# Altium footprint library THU.PcbLib: 477 footprints (part 15 of 30)
Each footprint in its own frame and in the unit in brackets; x right, y up, seen from the top. Pads: shape width x height; smd on the part's side, far side on the other; paste and mask are expansions set on the pad; w line width, h text height; cw(c..) or ccw(c..) is an arc to the next point about the centre after c.
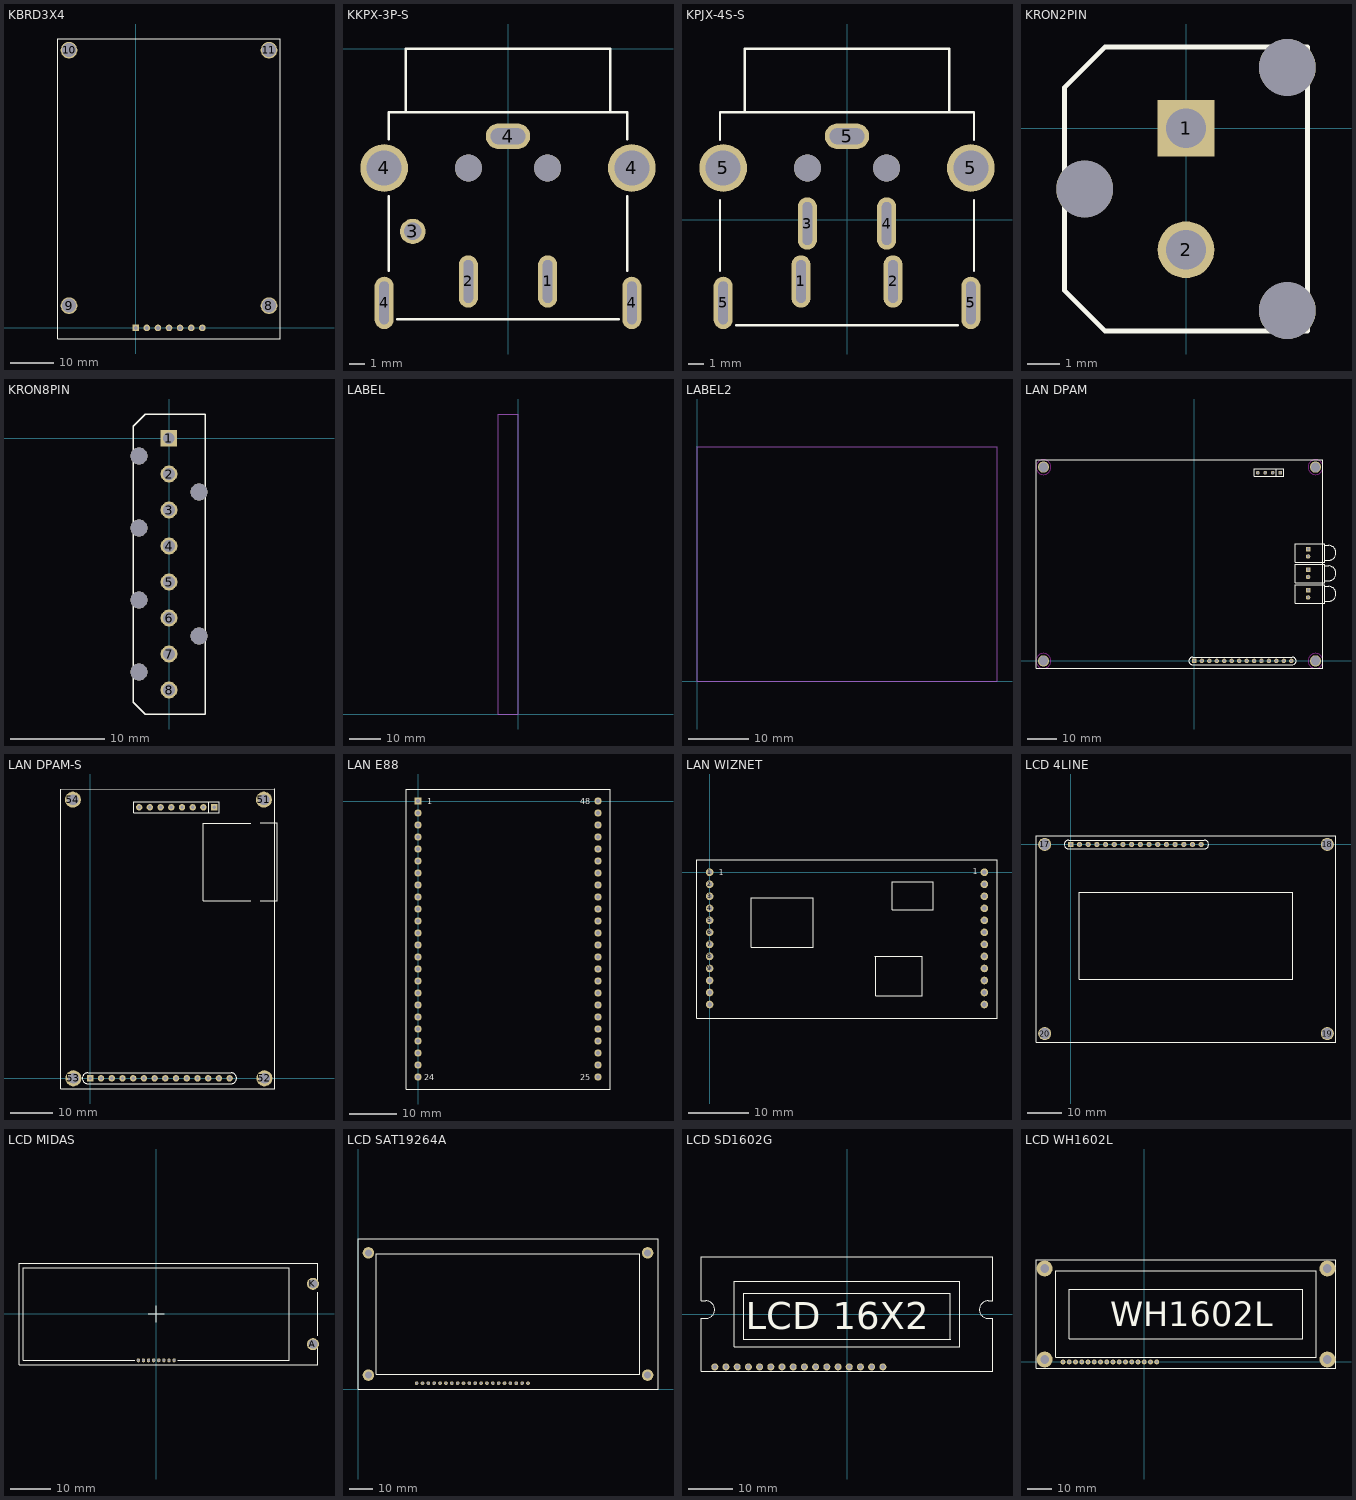
[diagram p14: the footprints below, top view; thin cyan lines are the x and y axes]

## KBRD3X4 [mil]
pads (11):
  rect 60x60 hole 34: 1(0,0)
  round 60 hole 34: 2(100,0) 3(200,0) 4(300,0) 5(400,0) 6(500,0) 7(600,0)
  round 150 hole 125: 8(1200,200) 9(-600,200) 10(-600,2500) 11(1200,2500)
TopOverlay:
  lines w6: -700,-100 -700,2600 1300,2600 1300,-100 -700,-100

## KKPX-3P-S [mm] "DC Power connector:  KPJX Series"
height 12.8
pads (10):
  oval 1.2x3.3 hole 0.6 slot 2.7 at 90 deg: 1(2.5,-14.65) 2(-2.5,-14.65) 4(-7.8,-16) 4(7.8,-16)
  round 1.6 hole 1.1: 3(-6,-11.5)
  round 3 hole 2.2: 4(-7.8,-7.5) 4(7.8,-7.5)
  oval 2.8x1.6 hole 1 slot 2.2 at 0 deg unplated: 4(0,-5.5)
  round 1.7 hole 1.7 unplated: ""(-2.5,-7.5) ""(2.5,-7.5)
TopOverlay:
  lines w0.152: -7.5,-13.963 -7.5,-9.264 ; -7.5,-5.708 -7.5,-4 0,-4 7.5,-4 7.5,-5.708 ; -6.985,-17.018 6.985,-17.018 ; -6.45,-4 -6.45,0 0,0 6.45,0 6.45,-4 ; 7.5,-13.963 7.5,-9.264

## KPJX-4S-S [mm] "DC POWER JACK - 4 POSITION"
height 15
pads (11):
  oval 1.2x3.3 hole 0.6 slot 2.7 at 90 deg: 1(-2.9,-3.9) 2(2.9,-3.9) 3(-2.5,-0.25) 4(2.5,-0.25) 5(-7.8,-5.25) 5(7.8,-5.25)
  round 3 hole 2.2: 5(-7.8,3.25) 5(7.8,3.25)
  oval 2.8x1.6 hole 1 slot 2.2 at 0 deg: 5(0,5.25)
  round 1.7 hole 1.7 unplated: ""(-2.5,3.25) ""(2.5,3.25)
TopOverlay:
  lines w0.152: -8.001,1.225 -8,-3.22 ; -8,5.036 -8,6.75 ; -7.937,6.75 0,6.75 7.937,6.75 ; -6.985,-6.649 6.985,-6.649 ; -6.45,6.75 -6.45,10.75 0,10.75 6.45,10.75 6.45,6.75 ; 8,-3.22 8.001,1.225 ; 8,5.036 8,6.75
3D body "KPJXHT-4S-S_rA6.STEP": height 15.02, standoff -3.48, extent -8.025,-6.756 7.975,10.744

## KRON2PIN [mil]
pads (5):
  rect 70x70 hole 49: 1(0,0)
  round 70 hole 49: 2(0,-150)
  round 70 hole 70: ""(-125,-75) ""(125,-225) ""(125,75)
TopOverlay:
  lines w6: -150,-200 -100,-250 150,-250 150,100 -100,100 -150,50 -150,-200

## KRON8PIN [mil]
pads (14):
  rect 70x70 hole 49: 1(-0.98,-0.98)
  round 70 hole 49: 2(0,-150) 3(0,-300) 4(0,-450) 5(0,-600) 6(0,-750) 7(0,-900) 8(0,-1050)
  round 70 hole 70: ""(-125,-975) ""(-125,-675) ""(-125,-375) ""(-125,-75) ""(125,-825) ""(125,-225)
TopOverlay:
  lines w6: 150,-850 150,-500 ; 150,-800 150,-1150 -100,-1150 -150,-1100 -150,50 -100,100 150,100 150,-250 ; 150,-550 150,-200

## LABEL [mil]
Mechanical2:
  lines w6: -250,0 -250,3750 0,3750 0,0 -250,0

## LABEL2 [mil]
Mechanical2:
  lines w6: 0,0 1950,0 1950,1525 0,1525 0,0

## LAN DPAM [mil]
pads (28):
  rect 60x60 hole 34: 1(0,0) 20(1524.55,951) 22(1524.55,1226) 24(1524.55,1501)
  round 60 hole 34: 2(100,0) 3(200,0) 4(300,0) 5(400,0) 6(500,0) 7(600,0) 8(700,0) 9(800,0) 10(900,0) 11(1000,0) 12(1100,0) 13(1200,0) 14(1300,0) 19(1524.55,851) 21(1524.55,1126) 23(1524.55,1401)
  rect 50x50 hole 34: 15(1150,2525)
  round 50 hole 34: 16(1050,2525) 17(950,2525) 18(850,2525)
  round 150 hole 125: ""(-2025,0) ""(-2025,2600) ""(1625,0) ""(1625,2600)
TopOverlay:
  lines w6: 1100,2475 1100,2575 ; 1749.55,799 1799.55,799 ccw(c1799.55,899) 1799.55,999 1749.55,999 ; 1749.55,1074 1799.55,1074 ccw(c1799.55,1174) 1799.55,1274 1749.55,1274 ; 1749.55,1349 1799.55,1349 ccw(c1799.55,1449) 1799.55,1549 1749.55,1549 ; -2125,-100 -2125,2700 1725,2700 1725,-100 -2125,-100 ; -25,-50 cw(c-25,0) -25,50 1315,50 cw(c1315,0) 1315,-50 -25,-50 ; 800,2475 800,2575 1200,2575 1200,2475 800,2475 ; 1349.55,774 1749.55,774 1749.55,1024 1349.55,1024 1349.55,774 ; 1349.55,1049 1349.55,1299 1749.55,1299 1749.55,1049 1349.55,1049 ; 1349.55,1324 1749.55,1324 1749.55,1574 1349.55,1574 1349.55,1324
KeepOutLayer:
  circle w6: c-2025,0 r100
  circle w6: c-2025,2600 r100
  circle w6: c1625,0 r100
  circle w6: c1625,2600 r100

## LAN DPAM-S [mil]
pads (26):
  rect 60x60 hole 32: 1(0,0) 15(1155.5,2528.97)
  round 60 hole 32: 2(100,0) 3(200,0) 4(300,0) 5(400,0) 6(500,0) 7(600,0) 8(700,0) 9(800,0) 10(900,0) 11(1000,0) 12(1100,0) 13(1200,0) 14(1300,0) 16(1055.5,2528.97) 17(955.5,2528.97) 18(855.5,2528.97) 19(755.5,2528.97) 20(655.5,2528.97) 21(555.5,2528.97) 22(455.5,2528.97)
  round 150 hole 100: 51(1620,2600) 52(1625,0) 53(-157.48,0) 54(-162.48,2600)
TopOverlay:
  lines w6: 1105.5,2478.97 1105.5,2578.97 ; 1496.5,1657.5 1054,1657.5 1054,2382.5 1496.5,2382.5 ; 1584,1655 1744,1655 1744,2385 1584,2385 ; -275.59,-98.42 -275.59,2696.85 1720,2700 1720,-100 -275.59,-98.42 ; -25,-50 cw(c-25,0) -25,50 1315,50 cw(c1315,0) 1315,-50 -25,-50 ; 405.5,2478.97 405.5,2578.97 1205.5,2578.97 1205.5,2478.97 405.5,2478.97

## LAN E88 [mil]
pads (48):
  rect 60x60 hole 34: 1(0,0)
  round 60 hole 34: 2(0,-100) 3(0,-200) 4(0,-300) 5(0,-400) 6(0,-500) 7(0,-600) 8(0,-700) 9(0,-800) 10(0,-900) 11(0,-1000) 12(0,-1100) 13(0,-1200) 14(0,-1300) 15(0,-1400) 16(0,-1500) 17(0,-1600) 18(0,-1700) 19(0,-1800) 20(0,-1900) 21(0,-2000) 22(0,-2100) 23(0,-2200) 24(0,-2300) 25(1500,-2300) 26(1500,-2200) 27(1500,-2100) 28(1500,-2000) 29(1500,-1900) 30(1500,-1800) 31(1500,-1700) 32(1500,-1600) 33(1500,-1500) 34(1500,-1400) 35(1500,-1300) 36(1500,-1200) 37(1500,-1100) 38(1500,-1000) 39(1500,-900) 40(1500,-800) 41(1500,-700) 42(1500,-600) 43(1500,-500) 44(1500,-400) 45(1500,-300) 46(1500,-200) 47(1500,-100) 48(1500,0)
TopOverlay:
  lines w6: -100,-2400 -100,100 1600,100 1600,-2400 -100,-2400
  text "48" at 1350,-25 h50
  text "25" at 1350,-2325 h50
  text "24" at 50,-2325 h50
  text "1" at 75,-25 h50

## LAN WIZNET [mm]
pads (24):
  round 1.27 hole 0.762: 1(0,0) 2(0,-2) 3(0,-4) 4(0,-6) 5(0,-8) 6(0,-10) 7(0,-12) 8(0,-14) 9(0,-16) 10(0,-18) 11(0,-20) 12(0,-22) 13(45.7,-22) 14(45.7,-20) 15(45.7,-18) 16(45.7,-16) 17(45.7,-14) 18(45.7,-12) 19(45.7,-10) 20(45.7,-8) 21(45.7,-6) 22(45.7,-4) 23(45.7,-2) 24(45.7,0)
TopOverlay:
  lines w0.152: 27.5,-14 27.6,-14 ; 27.6,-14 27.6,-20.5 35.4,-20.5 35.4,-14 27.6,-14 ; -2.1,-24.3 47.8,-24.3 47.8,2.1 -2.1,2.1 -2.1,-24.3 ; 6.9,-12.5 6.9,-4.2 17.2,-4.2 17.2,-12.5 6.9,-12.5 ; 30.4,-6.2 30.4,-1.6 37.2,-1.6 37.2,-5.8 37.2,-6.2 30.4,-6.2
  text "1" at 1.5,-0.5 h1
  text "1" at 43.8,-0.3 h1

## LCD 4LINE [mil]
pads (20):
  rect 60x60 hole 34: 1(0,0)
  round 60 hole 34: 2(100,0) 3(200,0) 4(300,0) 5(400,0) 6(500,0) 7(600,0) 8(700,0) 9(800,0) 10(900,0) 11(1000,0) 12(1100,0) 13(1200,0) 14(1300,0) 15(1400,0) 16(1500,0)
  round 150 hole 125: 17(-300,0) 18(2950,0) 19(2950,-2175) 20(-300,-2175)
TopOverlay:
  lines w6: -400,-2275 -400,100 3050,100 3050,-2275 -400,-2275 ; -25,-50 cw(c-25,0) -25,50 1535,50 cw(c1535,0) 1535,-50 -25,-50 ; 100,-1550 2550,-1550 2550,-550 100,-550 100,-1550

## LCD MIDAS [mm] "16X2"
height 6.3
pads (10):
  oval 0.8x1 hole 0.6: 1(-4.445,-11.506) 2(-3.175,-11.506) 3(-1.905,-11.506) 4(-0.635,-11.506) 5(0.635,-11.506) 6(1.905,-11.506) 7(3.175,-11.506) 8(4.445,-11.506)
  round 3 hole 2.2: A(38.95,-7.5) K(38.95,7.5)
TopOverlay:
  lines w0.127: -5.289,-11.506 -33,-11.506 -33,11.494 33,11.494 33,-11.506 5.289,-11.506 ; -2,0 0,0 ; 0,-2 0,0 ; 0,2 0,0 ; 2,0 0,0 ; 40.1,-8.541 40.1,-12.606 -34.1,-12.606 -34.1,12.594 40.1,12.594 40.1,8.528 ; 40.1,-5.416 40.1,-0.006 40.1,5.404

## LCD SAT19264A [mm] "GRAPHIC LCD"
height 10
pads (24):
  round 1.6 hole 1: 1(73.66,2.54) 2(71.12,2.54) 3(68.58,2.54) 4(66.04,2.54) 5(63.5,2.54) 6(60.96,2.54) 7(58.42,2.54) 8(55.88,2.54) 9(53.34,2.54) 10(50.8,2.54) 11(48.26,2.54) 12(45.72,2.54) 13(43.18,2.54) 14(40.64,2.54) 15(38.1,2.54) 16(35.56,2.54) 17(33.02,2.54) 18(30.48,2.54) 19(27.94,2.54) 20(25.4,2.54)
  round 5 hole 3: ""(4.5,6) ""(4.5,59) ""(125.5,6) ""(125.5,59)
TopOverlay:
  lines w0.254: 0,0 0,65 130,65 130,0 0,0 ; 8.001,6.5 8.001,58.5 122.047,58.5 122.047,6.5 8.001,6.5
3D body: height 12.25, standoff 4.1, extent 8.001,6.477 122.047,58.547
3D body: height 4.1, standoff 2.5, extent 0,0 130.048,65.024
3D body: height 2.5, standoff 0, extent 0,0 130.048,65.024

## LCD SD1602G [mm] "16 X 2 LINE DISPLAY"
height 12
pads (16):
  round 1.6 hole 1: 1(3.048,-11.991) 2(0.508,-11.991) 3(-2.032,-11.991) 4(-4.572,-11.991) 5(-7.112,-11.991) 6(-9.652,-11.991) 7(-12.192,-11.991) 8(-14.732,-11.991) 9(-17.272,-11.991) 10(-19.812,-11.991) 11(-22.352,-11.991) 12(-24.892,-11.991) 13(-27.432,-11.991) 14(-29.972,-11.991) 15(8.128,-11.991) 16(5.588,-11.991)
TopOverlay:
  lines w0.127: -23.47,-5.759 0,-5.759 23.47,-5.759 ; -23.43,-5.719 -23.43,4.741 0,4.741 23.43,4.741 23.43,-5.719 ; -33,2.988 -32.004,2.988 cw(c-32,0.991) -32.004,-1.007 -32.981,-1.007 -32.981,-12.991 32.981,-12.991 32.981,-1.007 32.004,-1.007 cw(c32,0.991) 32.004,2.988 33,2.988 33,12.991 -33,12.991 -33,2.988 ; -25.5,-7.409 -25.5,7.391 0,7.391 25.5,7.391 25.5,-7.409 0,-7.409 -25.5,-7.409
  text "LCD 16X2" at -22.911,-3.454 h6.1

## LCD WH1602L [mm] "CHARACTER 16x2"
height 0.345
pads (20):
  round 2 hole 1: 1(0,0) 2(-2.54,0) 3(-5.08,0) 4(-7.62,0) 5(-10.16,0) 6(-12.7,0) 7(-15.24,0) 8(-17.78,0) 9(-20.32,0) 10(-22.86,0) 11(-25.4,0) 12(-27.94,0) 13(-30.48,0) 14(-33.02,0) 15(2.54,0) 16(5.08,0)
  round 6.5 hole 3.5: ""(-40.5,1) ""(-40.5,38) ""(74.5,1) ""(74.5,38)
TopOverlay:
  lines w0.152: 0,0 0.127,-0.127 ; -44,-2.5 -44,41.5 78,41.5 78,-2.5 -44,-2.5 ; -35.9,1.9 69.9,1.9 69.9,37.1 -35.9,37.1 -35.9,1.9 ; -30.42,9.5 64.42,9.5 64.42,29.5 -30.42,29.5 -30.42,9.5
  text "WH1602L" at -13.901,14.518 h10